# Altium integrated library Pre-Assembled Units.IntLib: 2 symbols
Pins are listed as number, name and electrical type; pins without a type are passive.

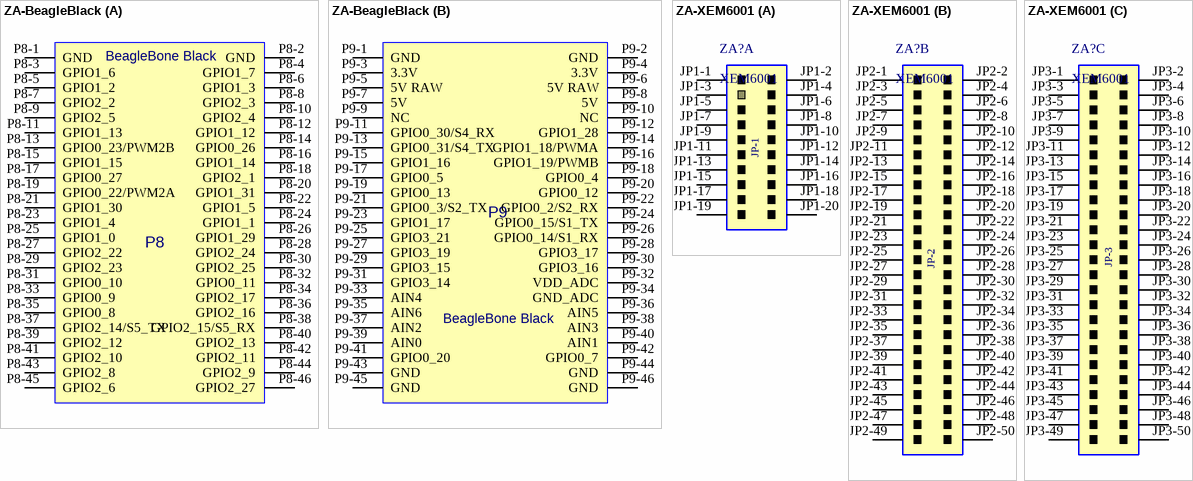
[diagram p0: symbols ZA-BeagleBlack to ZA-XEM6001]

## ZA-BeagleBlack
designator ZA?, comment Beagle Bone Black  (value not drawn)
Beaglebone Black, system on a board, ARM Cortex A8 processor, 4GB flash, 2GB DDR RAM; Manufacturer: Newark / Element 14; Mounting Type: Pin and Socket; PackageDescription: Generic Cape layout; PackageReference: BeagleBone Cape; Part Number: Beagle Bone Black; Type: Module; Supplier 1: Newark; Supplier Part Number 1: 52X5548; Supplier 2: Mouser; Supplier Part Number 2: 713-102110001
footprint BeagleBoneBlack (BeagleBone Black)
part A pins: P8-1 GND, P8-2 GND, P8-3 GPIO1_6, P8-4 GPIO1_7, P8-5 GPIO1_2, P8-6 GPIO1_3, P8-7 GPIO2_2, P8-8 GPIO2_3, P8-9 GPIO2_5, P8-10 GPIO2_4, P8-11 GPIO1_13, P8-12 GPIO1_12, P8-13 GPIO0_23/PWM2B, P8-14 GPIO0_26, P8-15 GPIO1_15, P8-16 GPIO1_14, P8-17 GPIO0_27, P8-18 GPIO2_1, P8-19 GPIO0_22/PWM2A, P8-20 GPIO1_31, P8-21 GPIO1_30, P8-22 GPIO1_5, P8-23 GPIO1_4, P8-24 GPIO1_1, P8-25 GPIO1_0, P8-26 GPIO1_29, P8-27 GPIO2_22, P8-28 GPIO2_24, P8-29 GPIO2_23, P8-30 GPIO2_25, P8-31 GPIO0_10, P8-32 GPIO0_11, P8-33 GPIO0_9, P8-34 GPIO2_17, P8-35 GPIO0_8, P8-36 GPIO2_16, P8-37 GPIO2_14/S5_TX, P8-38 GPIO2_15/S5_RX, P8-39 GPIO2_12, P8-40 GPIO2_13, P8-41 GPIO2_10, P8-42 GPIO2_11, P8-43 GPIO2_8, P8-44 GPIO2_9, P8-45 GPIO2_6, P8-46 GPIO2_27
part B pins: P9-1 GND, P9-2 GND, P9-3 3.3V, P9-4 3.3V, P9-5 5V RAW, P9-6 5V RAW, P9-7 5V, P9-8 5V, P9-9 NC, P9-10 NC, P9-11 GPIO0_30/S4_RX, P9-12 GPIO1_28, P9-13 GPIO0_31/S4_TX, P9-14 GPIO1_18/PWMA, P9-15 GPIO1_16, P9-16 GPIO1_19/PWMB, P9-17 GPIO0_5, P9-18 GPIO0_4, P9-19 GPIO0_13, P9-20 GPIO0_12, P9-21 GPIO0_3/S2_TX, P9-22 GPIO0_2/S2_RX, P9-23 GPIO1_17, P9-24 GPIO0_15/S1_TX, P9-25 GPIO3_21, P9-26 GPIO0_14/S1_RX, P9-27 GPIO3_19, P9-28 GPIO3_17, P9-29 GPIO3_15, P9-30 GPIO3_16, P9-31 GPIO3_14, P9-32 VDD_ADC, P9-33 AIN4, P9-34 GND_ADC, P9-35 AIN6, P9-36 AIN5, P9-37 AIN2, P9-38 AIN3, P9-39 AIN0, P9-40 AIN1, P9-41 GPIO0_20, P9-42 GPIO0_7, P9-43 GND, P9-44 GND, P9-45 GND, P9-46 GND
part A text: BeagleBone Black; P8
part B text: P9; BeagleBone Black

## ZA-XEM6001
designator ZA?, comment XEM6001
Opal Kelly XEM6001 integration module.  Spartan 6 FPGA based, USB interface, JTAG interface.; Manufacturer: Opal Kelly; Mounting Type: Pin and socket; PackageDescription: Opal Kelly XEM 6001, Small form-factor -- credit-card sized (3.5" x 2.0" x 0.61" / 88.9mm x 50.8mm x 15.4mm); PackageReference: XEM6001; Part Number: XEM6001; Type: Module
footprint XEM6001 (Spartan 6 FPGA integration module, from Opal Kelly.)
part A pins: JP1-1, JP1-2, JP1-3, JP1-4, JP1-5, JP1-6, JP1-7, JP1-8, JP1-9, JP1-10, JP1-11, JP1-12, JP1-13, JP1-14, JP1-15, JP1-16, JP1-17, JP1-18, JP1-19, JP1-20
part B pins: JP2-1, JP2-2, JP2-3, JP2-4, JP2-5, JP2-6, JP2-7, JP2-8, JP2-9, JP2-10, JP2-11, JP2-12, JP2-13, JP2-14, JP2-15, JP2-16, JP2-17, JP2-18, JP2-19, JP2-20, JP2-21, JP2-22, JP2-23, JP2-24, JP2-25, JP2-26, JP2-27, JP2-28, JP2-29, JP2-30, JP2-31, JP2-32, JP2-33, JP2-34, JP2-35, JP2-36, JP2-37, JP2-38, JP2-39, JP2-40, JP2-41, JP2-42, JP2-43, JP2-44, JP2-45, JP2-46, JP2-47, JP2-48, JP2-49, JP2-50
part C pins: JP3-1, JP3-2, JP3-3, JP3-4, JP3-5, JP3-6, JP3-7, JP3-8, JP3-9, JP3-10, JP3-11, JP3-12, JP3-13, JP3-14, JP3-15, JP3-16, JP3-17, JP3-18, JP3-19, JP3-20, JP3-21, JP3-22, JP3-23, JP3-24, JP3-25, JP3-26, JP3-27, JP3-28, JP3-29, JP3-30, JP3-31, JP3-32, JP3-33, JP3-34, JP3-35, JP3-36, JP3-37, JP3-38, JP3-39, JP3-40, JP3-41, JP3-42, JP3-43, JP3-44, JP3-45, JP3-46, JP3-47, JP3-48, JP3-49, JP3-50
part A text: JP-1
part B text: JP-2
part C text: JP-3